# Altium footprint library 总库.PcbLib: 264 footprints (part 12 of 17)
Each footprint in its own frame and in the unit in brackets; x right, y up, seen from the top. Pads: shape width x height; smd on the part's side, far side on the other; paste and mask are expansions set on the pad; w line width, h text height; cw(c..) or ccw(c..) is an arc to the next point about the centre after c.
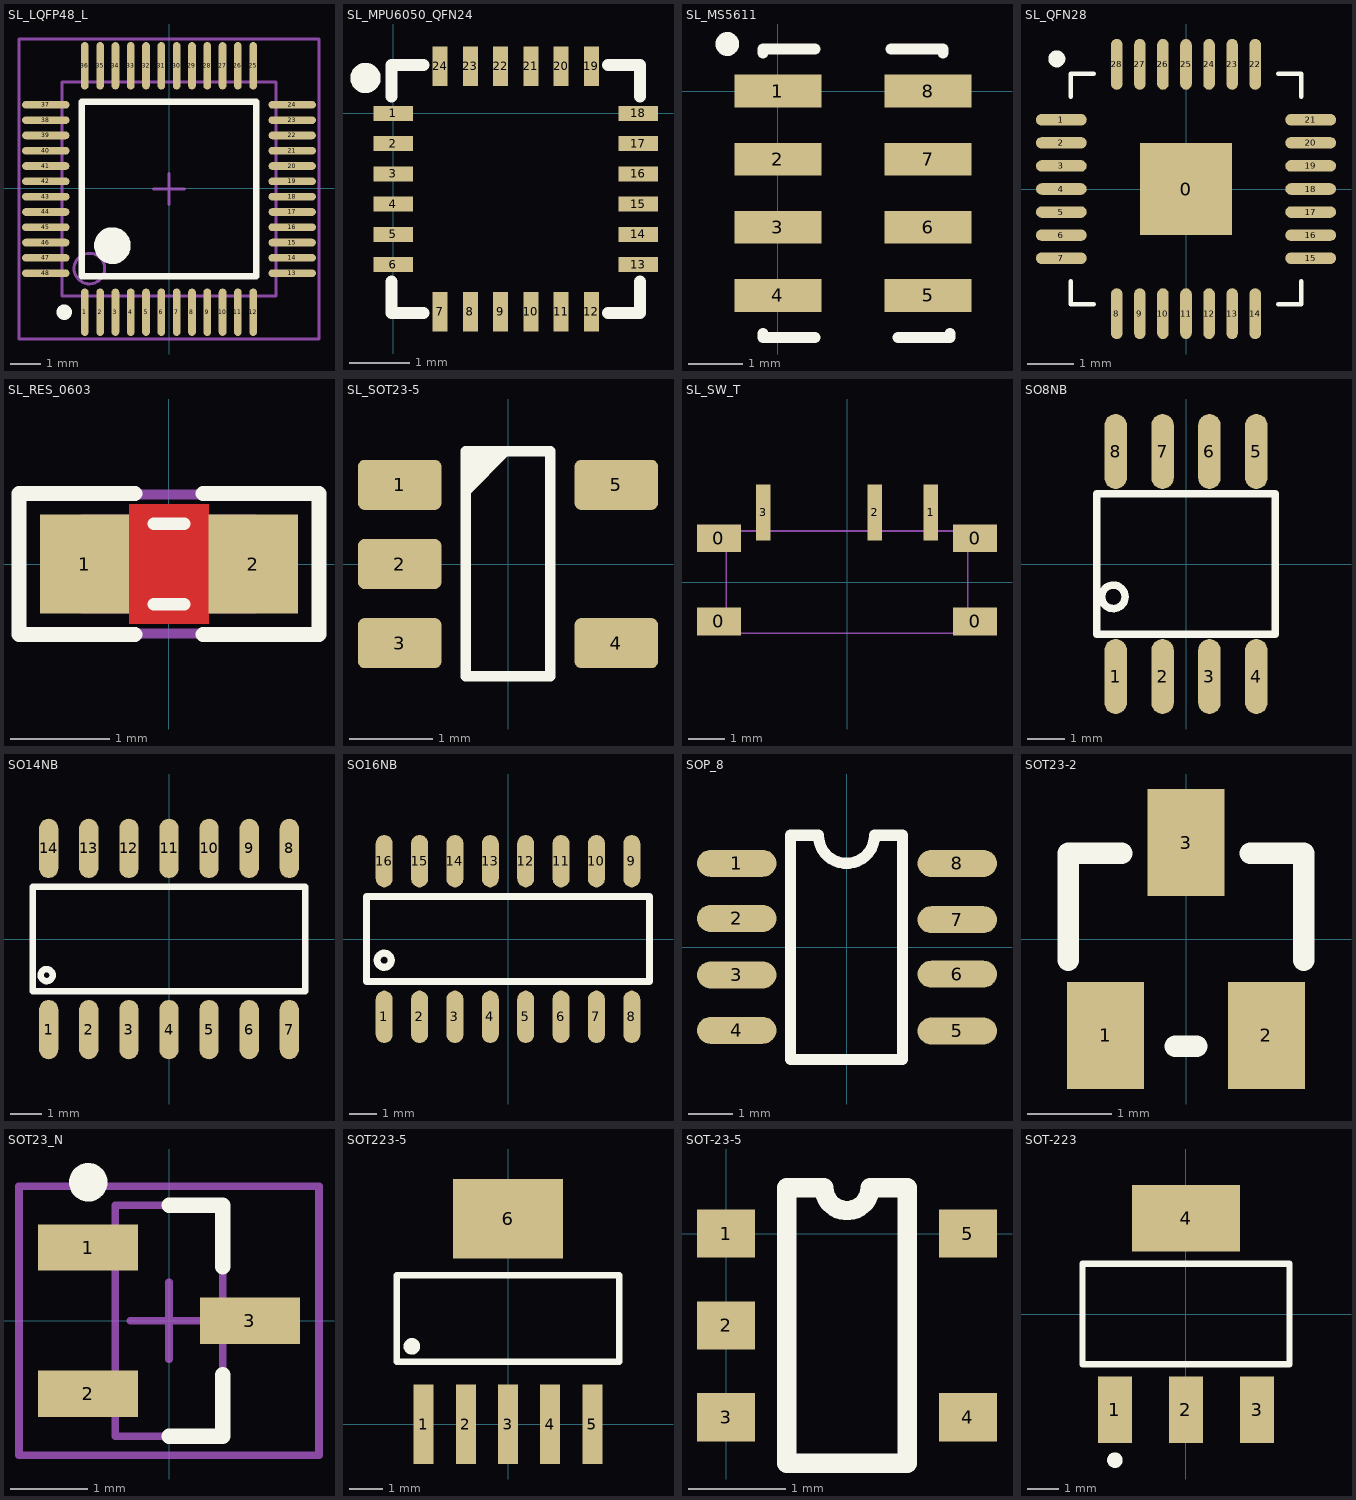
[diagram p11: the footprints below, top view; thin cyan lines are the x and y axes]

## SL_LQFP48_L [mm]
pads (48):
  oval 0.25x1.55 smd: 1(-2.75,-4.05) 2(-2.25,-4.05) 3(-1.75,-4.05) 4(-1.25,-4.05) 5(-0.75,-4.05) 6(-0.25,-4.05) 7(0.25,-4.05) 8(0.75,-4.05) 9(1.25,-4.05) 10(1.75,-4.05) 11(2.25,-4.05) 12(2.75,-4.05) 25(2.75,4) 26(2.25,4) 27(1.75,4) 28(1.25,4) 29(0.75,4) 30(0.25,4) 31(-0.25,4) 32(-0.75,4) 33(-1.25,4) 34(-1.75,4) 35(-2.25,4) 36(-2.75,4)
  oval 1.55x0.25 smd: 13(4.025,-2.775) 14(4.025,-2.275) 15(4.025,-1.775) 16(4.025,-1.275) 17(4.025,-0.775) 18(4.025,-0.275) 19(4.025,0.225) 20(4.025,0.725) 21(4.025,1.225) 22(4.025,1.725) 23(4.025,2.225) 24(4.025,2.725) 37(-4.025,2.725) 38(-4.025,2.225) 39(-4.025,1.725) 40(-4.025,1.225) 41(-4.025,0.725) 42(-4.025,0.225) 43(-4.025,-0.275) 44(-4.025,-0.775) 45(-4.025,-1.275) 46(-4.025,-1.775) 47(-4.025,-2.275) 48(-4.025,-2.775)
Top Overlay:
  circle w0.6: c-1.85,-1.875 r0.3
  circle w0.25: c-3.425,-4.05 r0.125
  lines w0.2: -2.85,-2.875 -2.85,2.825 2.85,2.825 2.85,-2.875 -2.85,-2.875
Mechanical 13:
  circle w0.1: c-2.6,-2.625 r0.5
  lines w0.1: -3.5,-3.525 -3.5,3.475 3.5,3.475 3.5,-3.525 -3.5,-3.525
Mechanical 15:
  lines w0.1: -0.5,-0.025 0.5,-0.025 ; 0,-0.525 0,0.475 ; -4.9,-4.925 -4.9,4.875 4.9,4.875 4.9,-4.925 -4.9,-4.925
3D body: height 1.6, standoff 0, extent -4.496,-4.556 4.53,4.47

## SL_MPU6050_QFN24 [mm] "QFN, 24-Leads, Body 4.1x4.1mm (max), Pitch 0.50mm, IPC Medium Density"
height 0.95
pads (24):
  rect 0.65x0.25 smd: 1(0,0) 2(0,-0.5) 3(0,-1) 4(0,-1.5) 5(0,-2) 6(0,-2.5) 13(4.05,-2.5) 14(4.05,-2) 15(4.05,-1.5) 16(4.05,-1) 17(4.05,-0.5) 18(4.05,0)
  rect 0.25x0.65 smd: 7(0.775,-3.275) 8(1.275,-3.275) 9(1.775,-3.275) 10(2.275,-3.275) 11(2.775,-3.275) 12(3.275,-3.275) 19(3.275,0.775) 20(2.775,0.775) 21(2.275,0.775) 22(1.775,0.775) 23(1.275,0.775) 24(0.775,0.775)
Top Overlay:
  circle w0.25: c-0.455,0.584 r0.125
  lines w0.2: -0.025,-2.775 -0.025,-3.3 0.5,-3.3 ; -0.025,0.275 -0.025,0.8 0.5,0.8 ; 3.55,-3.3 4.075,-3.3 4.075,-2.775 ; 3.55,0.8 4.075,0.8 4.075,0.275
3D body: height 0.9, standoff 0, extent 0.03,-3.242 4.034,0.762

## SL_MS5611 [mm] "QFN, 8-Leads, Body 5.00x3.00mm, Pitch 1.25mm/0.00mm, Thermal Pad 4.35x0.00mm, IPC Medium Density"
height 1
pads (8):
  rect 1.6x0.6 smd: 1(0,0) 2(0,-1.25) 3(0,-2.5) 4(0,-3.75) 5(2.754,-3.75) 6(2.754,-2.5) 7(2.754,-1.25) 8(2.754,0)
Top Overlay:
  circle w0.254: c-0.93,0.864 r0.092
  lines w0.2: -0.273,-4.45 -0.273,-4.525 0.677,-4.525 ; -0.273,0.7 -0.273,0.775 0.677,0.775 ; 2.077,0.775 3.027,0.775 3.027,0.7 ; 2.204,-4.525 3.154,-4.525 3.154,-4.45
3D body: height 1, standoff -0.05, extent -0.13,-4.38 2.87,0.62

## SL_QFN28 [mm]
pads (29):
  rect 2x2 smd: 0(0,0)
  oval 1.1x0.25 smd: 1(-2.7,1.5) 2(-2.7,1) 3(-2.7,0.5) 4(-2.7,0) 5(-2.7,-0.5) 6(-2.7,-1) 7(-2.7,-1.5) 15(2.7,-1.5) 16(2.7,-1) 17(2.7,-0.5) 18(2.7,0) 19(2.7,0.5) 20(2.7,1) 21(2.7,1.5)
  oval 0.25x1.1 smd: 8(-1.5,-2.7) 9(-1,-2.7) 10(-0.5,-2.7) 11(0,-2.7) 12(0.5,-2.7) 13(1,-2.7) 14(1.5,-2.7) 22(1.5,2.7) 23(1,2.7) 24(0.5,2.7) 25(0,2.7) 26(-0.5,2.7) 27(-1,2.7) 28(-1.5,2.7)
Top Overlay:
  circle w0.254: c-2.8,2.819 r0.057
  lines w0.1: -2.5,-2 -2.5,-2.5 -2,-2.5 ; -2.5,2 -2.5,2.5 -2,2.5 ; 2,-2.5 2.5,-2.5 2.5,-2 ; 2,2.5 2.5,2.5 2.5,2
3D body: height 1.07, standoff 0, extent -2.5,-2.511 2.5,2.489

## SL_RES_0603 [mm]
height 0.8
pads (2):
  rect 0.9x1 smd: 1(-0.85,0) 2(0.85,0)
Top Layer:
  pour cut-out: -0.4,0.6 0.4,0.6 0.4,-0.6 -0.4,-0.6
Top Overlay:
  lines w0.127: -0.152,-0.406 0.152,-0.406 ; -0.152,0.406 0.152,0.406
  lines w0.152: -0.342,-0.711 -1.51,-0.711 -1.51,0.711 -0.342,0.711 ; 0.344,-0.711 1.512,-0.711 1.512,0.711 0.344,0.711
Mechanical 13:
  lines w0.05: -0.875,-0.475 -0.475,-0.475 -0.475,0.475 -0.875,0.475 -0.875,-0.475 ; -0.475,-0.474 0.475,-0.474 -0.475,-0.474 ; -0.475,0.474 0.475,0.474 -0.475,0.474 ; 0.475,-0.475 0.475,0.475 0.875,0.475 0.875,-0.475 0.475,-0.475
Mechanical 14:
  lines w0.1: -1.5,-0.7 -1.5,0.7 1.5,0.7 1.5,-0.7 -1.5,-0.7
3D body: height 0.54, standoff -0.01, extent -0.875,-0.475 0.875,0.475

## SL_SOT23-5 [mm]
height 1.6
pads (5):
  rrect25% 1x0.6 smd: 1(-1.3,0.95) 2(-1.3,0) 3(-1.3,-0.95) 4(1.3,-0.95) 5(1.3,0.95)
Top Overlay:
  region: -0.508,1.353 0.053,1.353 -0.508,0.792
  lines w0.127: -0.508,-1.347 -0.508,1.353 0.508,1.353 0.508,-1.347 -0.508,-1.347
3D body: height 1.44, standoff -0.01, extent -1.4,-1.45 1.4,1.45

## SL_SW_T [mm]
pads (7):
  rect 1.2x0.762 smd: 0(-3.5,-1.073) 0(-3.5,1.2) 0(3.5,-1.073) 0(3.5,1.2)
  rect 0.4x1.524 smd: 1(2.286,1.905) 2(0.762,1.905) 3(-2.286,1.905)
Mechanical 13:
  lines w0.051: -3.302,-1.397 3.302,-1.397 3.302,1.397 -3.302,1.397 -3.302,-1.397
3D body: height 0.74, standoff 0, extent -2.007,-2.489 -0.838,-0.94
3D body: height 0.76, standoff 0, extent -3.327,-1.422 3.327,1.422

## SO8NB [mil]
pads (8):
  oval 24x80 smd: 1(-75,-120) 2(-25,-120) 3(25,-120) 4(75,-120) 5(75,120) 6(25,120) 7(-25,120) 8(-75,120)
Top Overlay:
  circle w8: c-77.5,-35 r12.5
  lines w8: -95,-75 -95,75 95,75 95,-75 -95,-75
3D body: height 61.02, standoff -1.97, extent -96.91,-117.91 96,117.91

## SO14NB [mil]
pads (14):
  oval 24x74 smd: 1(-150,-113) 2(-100,-113) 3(-50,-113) 4(0,-113) 5(50,-113) 6(100,-113) 7(150,-113) 8(150,113) 9(100,113) 10(50,113) 11(0,113) 12(-50,113) 13(-100,113) 14(-150,113)
Top Overlay:
  circle w8: c-152.5,-45 r7.5
  lines w8: -170,-65 170,-65 170,65 -170,65 -170,-65
3D body: height 61.02, standoff -1.97, extent -171.06,-117.83 171.06,118

## SO16NB [mil]
pads (16):
  oval 24x74 smd: 1(-175,-110) 2(-125,-110) 3(-75,-110) 4(-25,-110) 5(25,-110) 6(75,-110) 7(125,-110) 8(175,-110) 9(175,110) 10(125,110) 11(75,110) 12(25,110) 13(-25,110) 14(-75,110) 15(-125,110) 16(-175,110)
Top Overlay:
  circle w10: c-175,-30 r10
  lines w10: -200,-60 -200,60 200,60 200,-60 -200,-60
3D body: height 68.9, standoff 0, extent -193.83,-115 192,113.35

## SOP_8 [mm]
pads (8):
  oval 1.8x0.61 smd: 1(-2.5,1.9) 2(-2.5,0.65) 3(-2.5,-0.63) 4(-2.5,-1.887) 5(2.5,-1.9) 6(2.5,-0.612) 7(2.5,0.625) 8(2.5,1.897)
Top Overlay:
  lines w0.254: -1.281,-2.545 -1.281,2.535 -0.646,2.535 ccw(c-0.011,2.535) 0.624,2.535 1.259,2.535 1.259,-2.545 -1.281,-2.545
3D body: height 1.7, standoff 0, extent -3,-2.47 3,2.43

## SOT23-2 [mil]
pads (3):
  rect 36x50 smd: 1(-37.5,-45) 2(37.5,-45) 3(0,45)
Top Overlay:
  lines w10: -55,-10 -55,40 -30,40 ; -5,-50 5,-50 ; 30,40 55,40 55,-10
3D body: height 39.37, standoff -0.79, extent -57.48,-47 57.48,50.48

## SOT23_N [mm] "SOT23, 3-Leads, Body 2.9x1.3mm, Pitch 0.95mm, Lead Span 2.3mm, IPC Medium Density"
height 1.1
pads (3):
  rect 1.3x0.6 smd: 1(-1.05,0.95) 2(-1.05,-0.95) 3(1.05,0)
Top Overlay:
  circle w0.25: c-1.05,1.8 r0.125
  lines w0.2: 0,-1.5 0.7,-1.5 0.7,-0.7 ; 0,1.5 0.7,1.5 0.7,0.7
Mechanical 13:
  lines w0.1: -0.7,-1.5 0.7,-1.5 0.7,1.5 -0.7,1.5 -0.7,-1.5
Mechanical 15:
  lines w0.1: -0.5,0 0.5,0 ; 0,-0.5 0,0.5 ; -1.95,-1.75 1.95,-1.75 1.95,1.75 -1.95,1.75 -1.95,-1.75
3D body: height 1.1, standoff 0, extent -0.7,-1.5 0.7,1.5

## SOT223-5 [mm]
height 2
pads (6):
  rect 0.6x2.4 smd: 1(-2.54,0) 2(-1.27,0) 3(0,0) 4(1.27,0) 5(2.54,0)
  rect 3.3x2.4 smd: 6(0,6.181)
Top Overlay:
  circle w0.25: c-2.894,2.341 r0.125
  lines w0.2: -3.35,1.879 3.35,1.879 3.35,4.479 -3.35,4.479 -3.35,1.879
3D body: height 2.05, standoff -0.02, extent -3.275,-0.427 3.275,6.833

## SOT-23-5 [mm]
pads (5):
  rect 0.6x0.5 smd: 1(0,0) 2(0,-0.95) 3(0,-1.9) 4(2.5,-1.9) 5(2.5,0)
Top Overlay:
  lines w0.2: 0.627,-2.375 0.627,0.475 1.012,0.475 ccw(c1.25,0.475) 1.488,0.475 1.873,0.475 1.873,-2.375 0.627,-2.375
3D body: height 0.51, standoff 0, extent 0.25,-2.45 2.25,0.6

## SOT-223 [mm] "SOT-223/SC-73; 4 Leads; Body 6.7 x 7.3 mm, inc. leads (LxW max)"
height 1.78
pads (4):
  rect 1.1x2.15 smd: 1(-2.3,-3.1) 2(0,-3.1) 3(2.3,-3.1)
  rect 3.5x2.15 smd: 4(0,3.1)
Top Overlay:
  circle w0.25: c-2.3,-4.725 r0.125
  lines w0.2: -3.35,-1.625 3.35,-1.625 3.35,1.625 -3.35,1.625 -3.35,-1.625
3D body: height 1.65, standoff -0.03, extent -3.251,-3.58 3.249,3.38